# Altium footprint library PCBLIB.PcbLib: 775 footprints (part 25 of 49)
Each footprint in its own frame and in the unit in brackets; x right, y up, seen from the top. Pads: shape width x height; smd on the part's side, far side on the other; paste and mask are expansions set on the pad; w line width, h text height; cw(c..) or ccw(c..) is an arc to the next point about the centre after c.
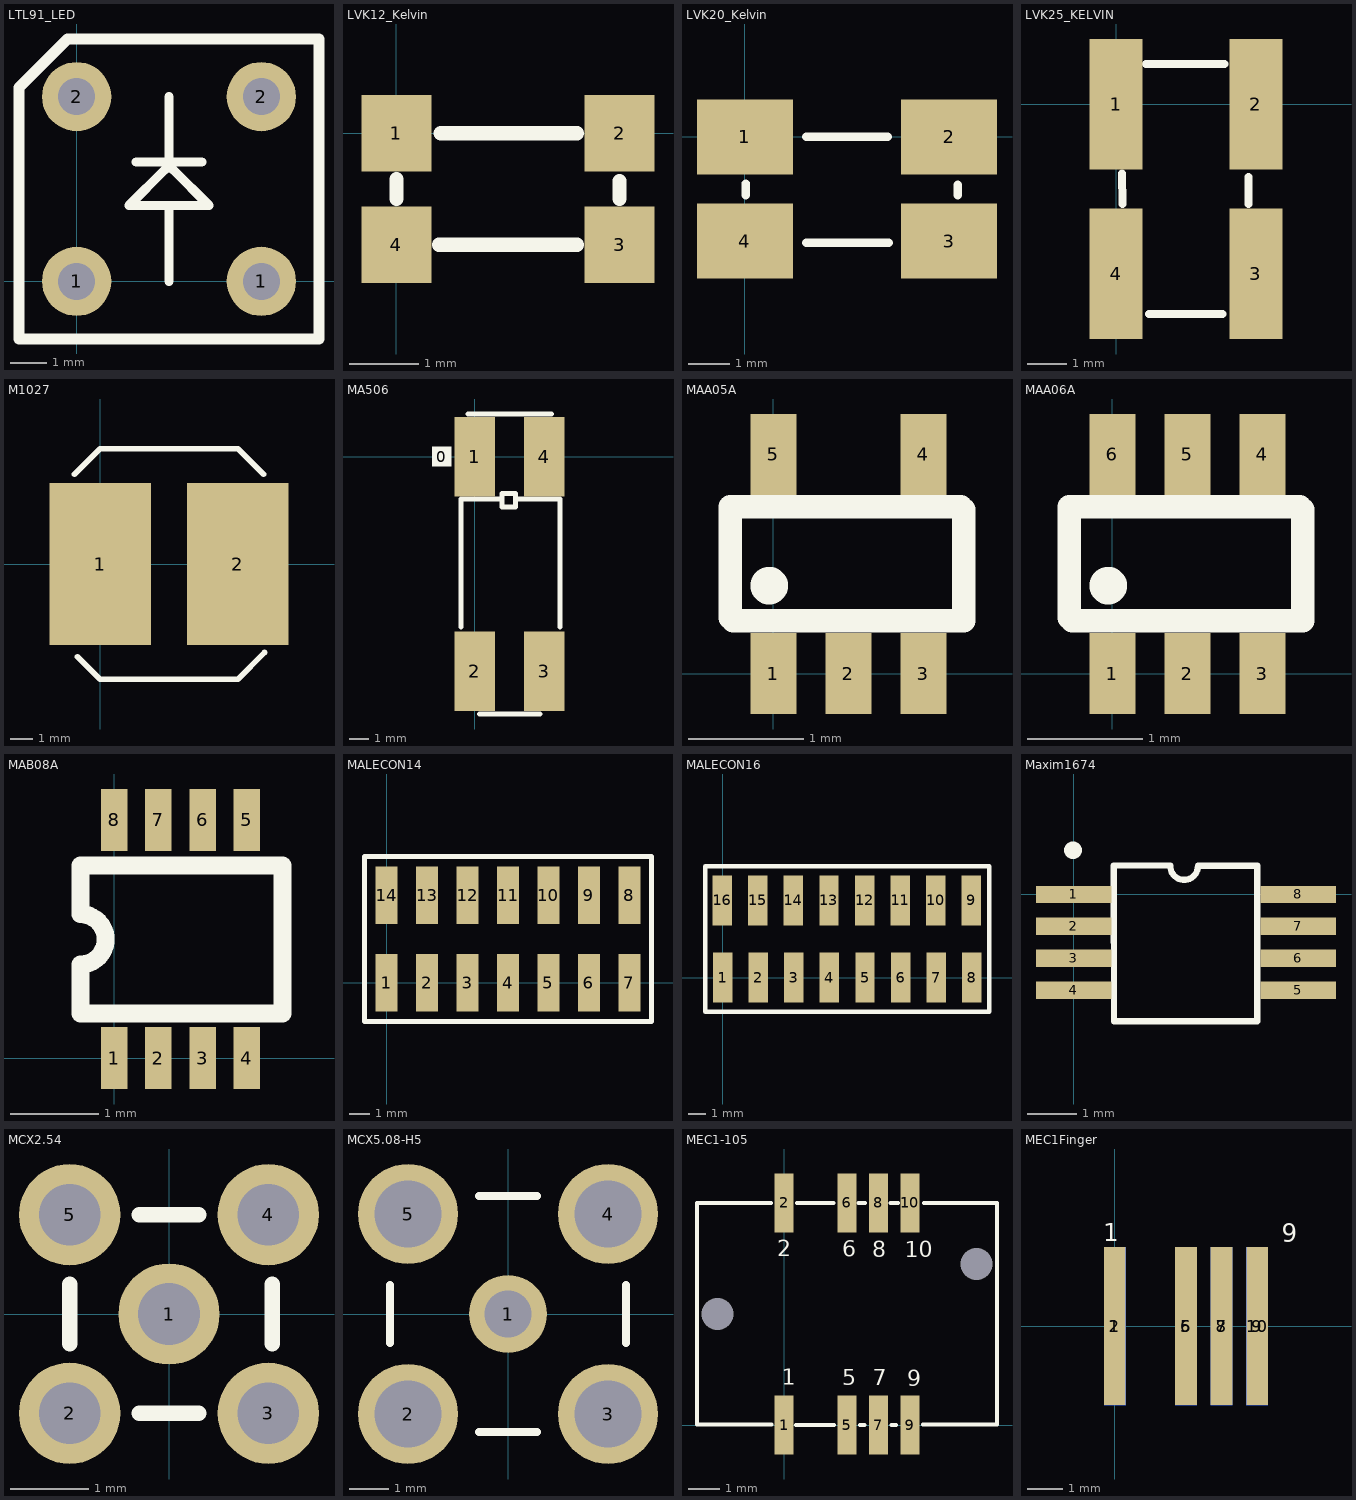
[diagram p24: the footprints below, top view; thin cyan lines are the x and y axes]

## LTL91_LED [mil]
pads (4):
  round 75 hole 40: 1(0,0) 1(200,0) 2(0,200) 2(200,200)
TopOverlay:
  lines w10: 64.57,129.39 135.43,129.39 ; 96.06,121.51 56.69,82.14 143.31,82.14 103.94,121.51 ; 100,0 100,82.14 ; 100,129.39 100,200
  lines w12: -62.5,-62.5 -62.5,210 -10,262.5 262.5,262.5 262.5,-62.5 -62.5,-62.5

## LVK12_Kelvin [mm]
height 0.5
pads (4):
  rect 1x1.1 smd: 1(0,0) 2(3.2,0) 3(3.2,-1.6) 4(0,-1.6)
TopOverlay:
  lines w0.203: 0,-0.94 0,-0.66 ; 0.61,-1.6 2.591,-1.6 ; 0.635,0 2.591,0 ; 3.2,-0.94 3.2,-0.686

## LVK20_Kelvin [mm]
height 0.5
pads (4):
  rect 2.3x1.8 smd: 1(0,0) 2(4.9,0) 3(4.9,-2.5) 4(0,-2.5)
TopOverlay:
  lines w0.203: 0.025,-1.397 0.025,-1.118 ; 1.473,-2.54 3.454,-2.54 ; 1.473,0 3.429,0 ; 5.105,-1.397 5.105,-1.143

## LVK25_KELVIN [mil]
height 19.68
pads (4):
  rect 53x130 smd: 1(0,0) 2(139.61,0) 3(139.61,-169.29) 4(0,-169.29)
TopOverlay:
  lines w8: 6.14,-69.17 6.24,-99.75 ; 29.99,40.09 108.37,40.09 ; 32.96,-209.52 106.3,-209.52 ; 132.13,-99.75 132.13,-72.73

## M1027 [mil]
pads (2):
  rect 175x280 smd: 1(0,0) 2(238,0)
TopOverlay:
  lines w10: -44,155 0,199 238,199 282,155 ; -39,-160 0,-199 238,-199 284,-153

## MA506 [mm] "Crystal"
height 4.19
pads (5):
  rect 1.016x1.016 on Top Overlay: 0(-1.702,0)
  rect 2.1x4.1 smd: 1(0,0) 2(0,-11.1) 3(3.6,-11.1) 4(3.6,0)
TopOverlay:
  lines w0.254: -0.7,-8.8 -0.7,-2.2 1.4,-2.2 ; -0.339,2.2 3.979,2.2 ; 0.246,-13.3 3.37,-13.3 ; 2.2,-2.2 4.4,-2.2 4.4,-8.8 ; 1.4,-2.6 1.4,-1.9 2.1,-1.9 2.1,-2.6 1.4,-2.6
Mechanical4:
  text ".181" at 0,0 h0.03

## MAA05A [mm]
pads (5):
  rect 0.4x0.7 smd: 1(0,0) 2(0.65,0) 3(1.3,0) 4(1.3,1.9) 5(0,1.9)
TopOverlay:
  circle w0.254: c-0.036,0.762 r0.036
  lines w0.203: -0.374,0.483 -0.374,1.448 1.626,1.448 ; -0.349,0.457 1.651,0.457 1.651,1.422
Mechanical4:
  text ".040" at 0,0 h0.03

## MAA06A [mm]
pads (6):
  rect 0.4x0.7 smd: 1(0,0) 2(0.65,0) 3(1.3,0) 4(1.3,1.9) 5(0.65,1.9) 6(0,1.9)
TopOverlay:
  circle w0.254: c-0.036,0.762 r0.036
  lines w0.203: -0.374,0.483 -0.374,1.448 1.626,1.448 ; -0.349,0.457 1.651,0.457 1.651,1.422
Mechanical4:
  text ".040" at 0,0 h0.03

## MAB08A [mm]
pads (8):
  rect 0.3x0.7 smd: 1(0,0) 2(0.5,0) 3(1,0) 4(1.5,0) 5(1.5,2.7) 6(1,2.7) 7(0.5,2.7) 8(0,2.7)
TopOverlay:
  lines w0.203: -0.381,0.508 -0.381,1.062 ccw(c-0.381,1.346) -0.381,1.63 -0.381,2.184 1.905,2.184 1.905,0.508 -0.381,0.508

## MALECON14 [mil]
pads (14):
  rect 43x112 smd: 1(0,0) 2(79,0) 3(158,0) 4(237,0) 5(316,0) 6(395,0) 7(474,0) 8(474,171) 9(395,171) 10(316,171) 11(237,171) 12(158,171) 13(79,171) 14(0,171)
TopOverlay:
  lines w10: -43,-76 -43,247 517,247 517,-76 -43,-76

## MALECON16 [mil]
pads (16):
  rect 43x112 smd: 1(0,0) 2(79,0) 3(158,0) 4(237,0) 5(316,0) 6(395,0) 7(474,0) 8(553,0) 9(552,171) 10(473,171) 11(394,171) 12(315,171) 13(236,171) 14(157,171) 15(78,171) 16(-1,171)
TopOverlay:
  lines w10: -39,-76 592,-76 592,247 -39,247 -39,-76

## Maxim1674 [mil] "DC-DC Converter"
height 43
pads (8):
  rect 60.5x14 smd: 1(0,0) 2(0,-25.6) 3(0,-51.2) 4(0,-76.8) 5(180.5,-76.8) 6(180.5,-51.2) 7(180.5,-25.6) 8(180.5,0)
TopOverlay:
  lines w5: 32.29,23.2 32.5,-101.8 147.46,-101.8 ; 32.35,23.21 77.47,23.21 ; 77.67,23.21 ccw(c88.76,22.81) 99.84,23.25 ; 99.95,23.01 147.39,23.01 ; 147.4,-101.8 147.4,23.2
  lines w14: -0.88,35.55 -0.26,35.55
Mechanical4:
  text ".040" at 0,0 h1
3D body: height 43.31, standoff 0, extent -8.42,-99.05 188.43,23

## MCX2.54 [mil] "Connector; RF Coaxial, MCX, Thru-Hole; 5 Position; Right-Angle"
height 230.31
pads (5):
  round 51 hole 31: 1(0,0) 2(-50,-50) 3(50,-50) 4(50,50) 5(-50,50)
TopOverlay:
  lines w7.87: -50,-15 -50,15 ; -15,-50 15,-50 ; -15,50 15,50 ; 52,-15 52,15

## MCX5.08-H5 [mil] "Connector; RF Coaxial, MCX, Thru-Hole; 5 Position; Right-Angle"
height 230.31
pads (5):
  round 78 hole 47: 1(0,0)
  round 100 hole 67: 2(-100,-100) 3(100,-100) 4(100,100) 5(-100,100)
TopOverlay:
  lines w7.87: -118.11,-29.13 -118.11,29.13 ; -29.13,-118.11 29.13,-118.11 ; -29.13,118.11 29.13,118.11 ; 118.11,-29.13 118.11,29.13

## MEC1-105 [mil]
height 350
pads (10):
  rect 24x74 smd: 1(0,0) 2(0,278) 5(78.74,0) 6(78.74,278) 7(118.11,0) 8(118.11,278) 9(157.48,0) 10(157.48,278)
  rect 1x1 hole 40: MH1(-83.56,139) MH2(241.03,201.5)
TopOverlay:
  lines w5: -16.3,277.74 -109.06,277.74 -109.06,0.38 -15.56,0.38 ; 15.19,0.1 62.65,0.1 ; 16.17,277.66 62.15,277.66 ; 93.39,277.74 101.17,277.74 ; 94.87,0.01 100.8,0.01 ; 133.06,277.74 142.33,277.74 ; 134.18,0.01 140.11,0.01 ; 173.85,0.38 266.54,0.38 266.54,277.74 174.96,277.74
  text "10" at 151.23,210.13 h20
  text "9" at 153.86,48.77 h20
  text "8" at 110.45,210.13 h20
  text "7" at 110.89,50.08 h20
  text "6" at 73.08,210.57 h20
  text "5" at 72.74,50.08 h20
  text "2" at -8.82,211.01 h20
  text "1" at -3.12,50.52 h20

## MEC1Finger [mil]
height 1
pads (8):
  rect 24x175 smd: 1(0,0) 5(78.8,0) 7(118.2,0) 9(157.6,0)
  rect 24x175 smd far side: 2(0,0) 6(78.8,0) 8(118.2,0) 10(157.6,0)
TopOverlay:
  text "9" at 184.8,93.41 h20
  text "1" at -12.69,94.3 h20
BottomOverlay:
  text "10" at 184.8,93.85 h20
  text "2" at -12.69,93.41 h20